# Altium footprint library Wurth_Elektronik_Electromechanic_Wire_to_Board_Connectors_rev16a.PCBLIB: 662 footprints (part 36 of 42)
Each footprint in its own frame and in the unit in brackets; x right, y up, seen from the top. Pads: shape width x height; smd on the part's side, far side on the other; paste and mask are expansions set on the pad; w line width, h text height; cw(c..) or ccw(c..) is an arc to the next point about the centre after c.
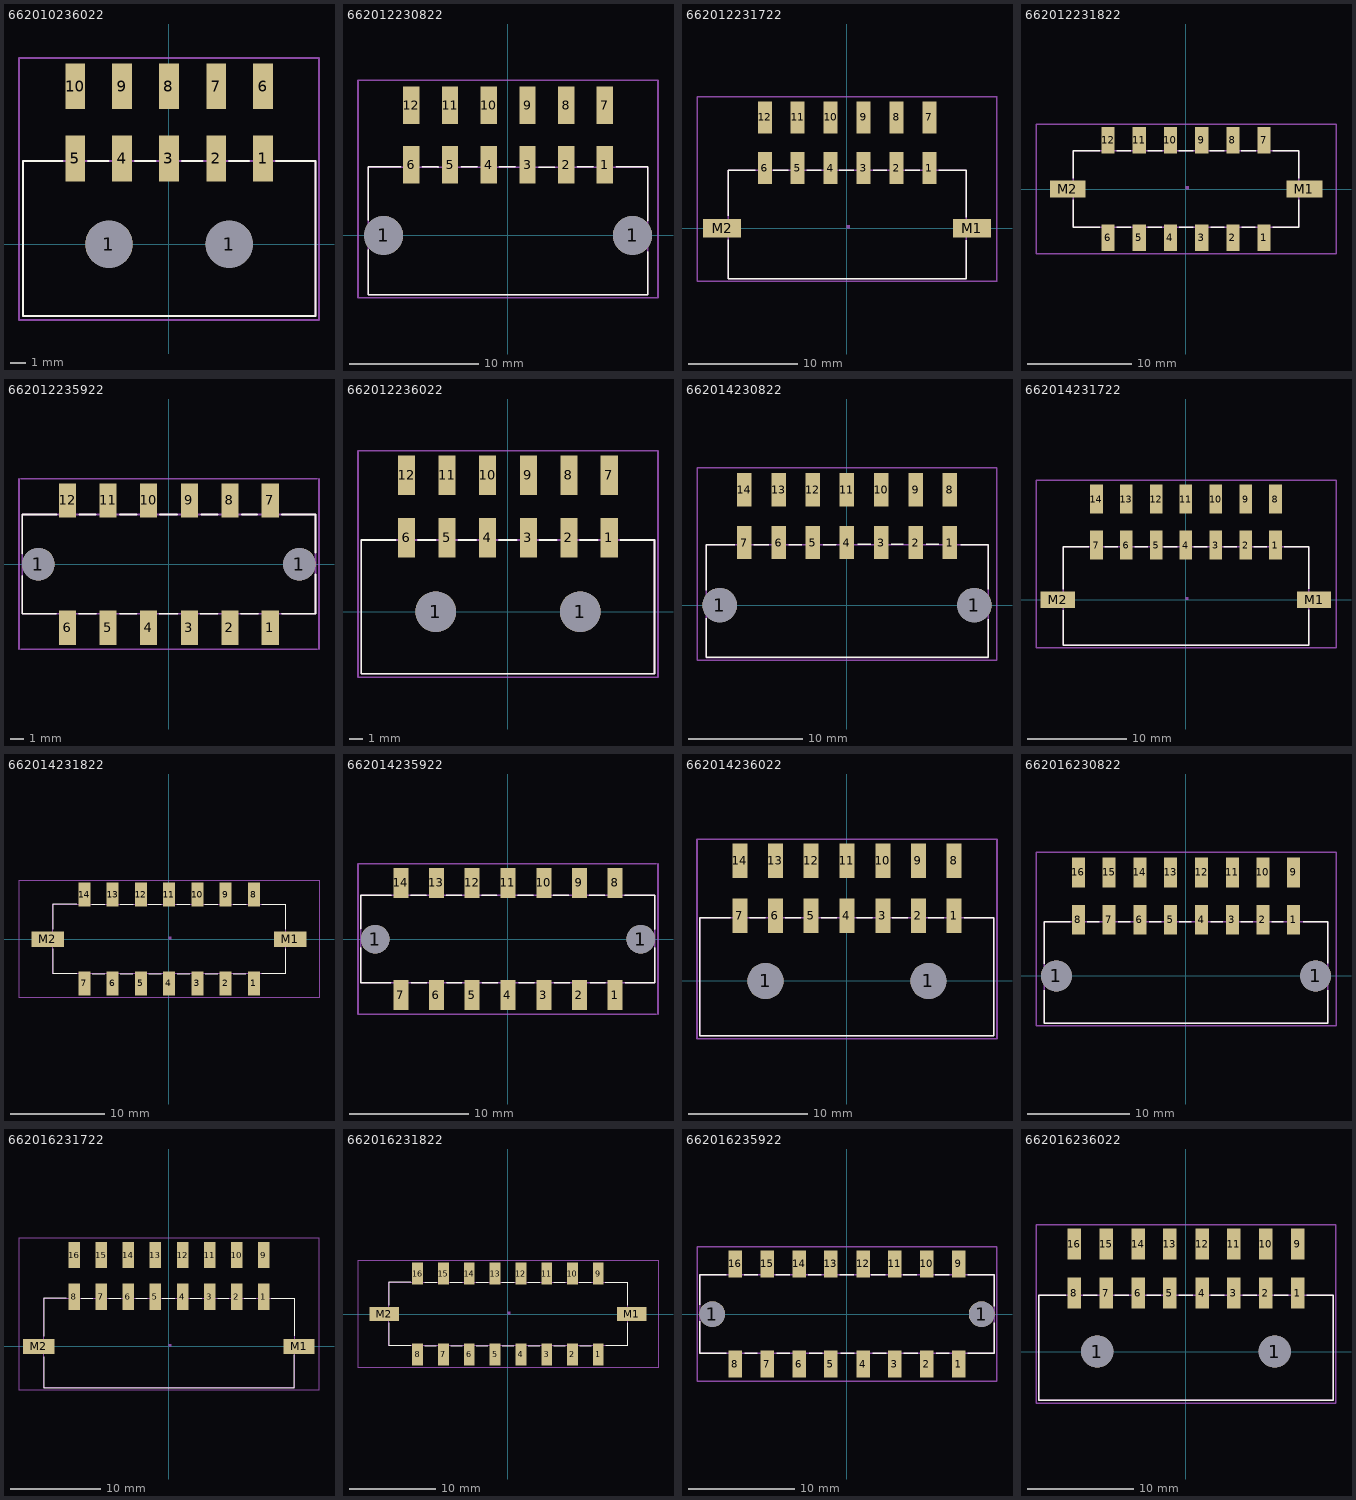
[diagram p35: the footprints below, top view; thin cyan lines are the x and y axes]

## 662010236022 [mil]
pads (12):
  round 119 hole 119: 1(-151.18,0) 1(152,0)
  rect 50x115 smd: 1(237,216) 2(119,216) 3(0,216) 4(-118.11,216) 5(-236.22,216) 6(237,398) 7(119,398) 8(0,398) 9(-118.11,398) 10(-236.22,398)
Top Overlay:
  lines w5: -267.72,209 -368.11,209 -368.11,-181.1 369,-181.1 369,209 269,209 ; -203.54,209 -151.97,209 ; -85.43,209 -33.86,209 ; 33,209 85,209 ; 151,209 202,209
Mechanical 2:
  text ">NAME" at 462,82 h77.5
Mechanical 4:
  text ">VALUE" at 462,7 h77.5
Mechanical 16:
  lines w5: -368.11,-181.1 369,-181.1 369,209 -368.11,209 -368.11,-181.1
  text "1" at 212,157 h77.5
  text "10" at -256.89,391 h77.5
Mechanical 27:
  lines w5: -377.95,-190.94 378,-190.94 378,469 -377.95,469 -377.95,-190.94

## 662012230822 [mil]
pads (14):
  round 119 hole 119: 1(-380.31,0) 1(381,0)
  rect 50x115 smd: 1(296,216) 2(178,216) 3(60,216) 4(-59.06,216) 5(-177.17,216) 6(-295.28,216) 7(296,398) 8(178,398) 9(60,398) 10(-59.06,398) 11(-177.17,398) 12(-295.28,398)
Top Overlay:
  lines w5: -427.17,-43.31 -427.17,-181.1 428,-181.1 428,-50.39 ; -427.17,47 -427.17,210 -327.95,210 ; -262.2,210 -213.78,210 -213.78,209 ; -142.91,210 -94.49,210 ; -26.77,210 22,210 ; 95,209 143,209 ; 212,210 260,210 ; 331,210 428,210 428,45
Mechanical 2:
  text ">NAME" at 521,82 h77.5
Mechanical 4:
  text ">VALUE" at 521,7 h77.5
Mechanical 16:
  lines w5: -427.17,-181.1 428,-181.1 428,209 -427.17,209 -427.17,-181.1
  text "1" at 271,157 h77.5
  text "12" at -329.72,332 h77.5
Mechanical 27:
  lines w5: -458.66,-190.94 459,-190.94 459,475 -458.66,475 -458.66,-190.94

## 662012231722 [mil]
pads (14):
  rect 50x115 smd: 1(296,216) 2(178,216) 3(60,216) 4(-59.06,216) 5(-177.17,216) 6(-295.28,216) 7(296,398) 8(178,398) 9(60,398) 10(-59.06,398) 11(-177.17,398) 12(-295.28,398)
  rect 136x65 smd: M1(449,0) M2(-448.62,0)
Top Overlay:
  lines w5: -427.17,-41.73 -427.17,-181.1 428,-181.1 428,-43.31 ; -427.17,45 -427.17,209 -330.31,209 ; -264.57,209 -211.02,209 ; -144.09,209 -92.91,209 ; -27.17,209 25,209 ; 94,209 143,209 ; 210,209 262,209 ; 329,209 428,209 428,40 ; -92.91,209 -92.91,209
Mechanical 2:
  text ">NAME" at 591,71 h77.5
Mechanical 4:
  text ">VALUE" at 596,-18.31 h77.5
Mechanical 10:
  region: 0,0 10,0 10,10 0,10
Mechanical 16:
  lines w5: -427.17,-181.1 428,-181.1 428,209 -427.17,209 -427.17,-181.1
  text "1" at 271,157 h77.5
  text "12" at -322.83,332 h77.5
Mechanical 27:
  lines w5: 538,473 538,-190.94 ; 539,-190.94 538,-190.94 ; 539,473 -538.98,473 -538.98,-190.94 538,-190.94

## 662012231822 [mil]
pads (14):
  rect 50x100 smd: 1(296,-185.04) 2(178,-185.04) 3(60,-185.04) 4(-59.06,-185.04) 5(-177.17,-185.04) 6(-295.28,-185.04) 7(296,186) 8(178,186) 9(60,186) 10(-59.06,186) 11(-177.17,186) 12(-295.28,186)
  rect 136x65 smd: M1(449,0) M2(-448.62,0)
Top Overlay:
  lines w5: -427.17,-39.76 -427.17,-144.88 -327.95,-144.88 ; -427.17,41 -427.17,145 -327.95,145 ; -263.39,145 -209.06,145 ; -262.2,-144.88 -209.84,-144.88 ; -145.28,145 -90.94,145 ; -144.09,-144.88 -91.73,-144.88 ; -27.17,145 28,145 ; -25.98,-144.88 27,-144.88 ; 91,145 146,145 ; 93,-144.88 145,-144.88 ; 210,145 264,145 ; 211,-144.88 263,-144.88 ; 329,145 428,145 428,41 ; 330,-144.88 428,-144.88 428,-39.76
Mechanical 2:
  text ">NAME" at 744,38 h77.5
Mechanical 4:
  text ">VALUE" at 741,-24.41 h77.5
Mechanical 10:
  region: 0,0 10,0 10,10 0,10
  region: 0,0 10,0 10,10 0,10
  region: 0,0 10,0 10,10 0,10
  region: 0,0 10,0 10,10 0,10
  region: 0,0 10,0 10,10 0,10
  region: 0,0 10,0 10,10 0,10
  region: 0,0 10,0 10,10 0,10
  region: 0,0 10,0 10,10 0,10
  region: 0,0 10,0 10,10 0,10
  region: 0,0 10,0 10,10 0,10
  region: 0,0 10,0 10,10 0,10
Mechanical 16:
  lines w5: -427.17,-144.88 428,-144.88 428,145 -427.17,145 -427.17,-144.88
  text "1" at 282,-216.14 h77.5
  text "12" at -338.19,167 h77.5
Mechanical 27:
  lines w5: -568.9,-246.06 -568.9,247 569,247 569,-246.06 -568.9,-246.06

## 662012235922 [mil]
pads (14):
  round 95 hole 95: 1(-380.31,0) 1(381,0)
  rect 50x100 smd: 1(296,-185.04) 2(178,-185.04) 3(60,-185.04) 4(-59.06,-185.04) 5(-177.17,-185.04) 6(-295.28,-185.04) 7(296,186) 8(178,186) 9(60,186) 10(-59.06,186) 11(-177.17,186) 12(-295.28,186)
Top Overlay:
  lines w5: -427.17,-33.86 -427.17,-144.88 -329.13,-144.88 ; -427.17,31 -427.17,145 -327.17,145 ; -261.81,-144.88 -212.6,-144.88 ; -261.02,145 -212.99,145 ; -142.91,145 -94.09,145 -94.09,146 ; -142.13,-144.88 -94.49,-144.88 ; -27.56,-144.88 25,-144.88 ; -26.38,145 24,145 ; 92,-144.88 142,-144.88 ; 95,145 142,145 ; 210,-144.88 260,-144.88 ; 213,145 258,145 ; 329,-144.88 428,-144.88 428,-30.32 ; 330,145 428,145 428,33
Mechanical 2:
  text ">NAME" at 596,50 h77.5
Mechanical 4:
  text ">VALUE" at 596,-25 h77.5
Mechanical 16:
  lines w5: -427.17,-144.88 428,-144.88 428,145 -427.17,145 -427.17,-144.88
  text "1" at 271,-200 h77.5
  text "12" at -340.94,155 h77.5
Mechanical 27:
  lines w5: -437.01,-248.03 -437.01,249 ; -431.1,-248.03 432,-248.03 ; -431.1,249 432,249 ; 438,-248.03 438,249

## 662012236022 [mil]
pads (14):
  round 119 hole 119: 1(-210.24,0) 1(211,0)
  rect 50x115 smd: 1(296,216) 2(178,216) 3(60,216) 4(-59.06,216) 5(-177.17,216) 6(-295.28,216) 7(296,398) 8(178,398) 9(60,398) 10(-59.06,398) 11(-177.17,398) 12(-295.28,398)
Top Overlay:
  lines w5: -326.77,209 -427.17,209 -427.17,-181.1 428,-181.1 428,209 328,209 ; -262.6,209 -211.02,209 ; -144.49,209 -92.91,209 ; -26.38,209 26,209 ; 92,209 143,209 ; 210,209 262,209
Mechanical 2:
  text ">NAME" at 521,82 h77.5
Mechanical 4:
  text ">VALUE" at 521,7 h77.5
Mechanical 16:
  lines w5: -427.17,-181.1 428,-181.1 428,209 -427.17,209 -427.17,-181.1
  text "1" at 271,157 h77.5
  text "12" at -315.94,391 h77.5
Mechanical 27:
  lines w5: -437.01,-190.94 438,-190.94 438,469 -437.01,469 -437.01,-190.94

## 662014230822 [mil]
pads (16):
  round 119 hole 119: 1(-439.37,0) 1(440,0)
  rect 50x115 smd: 1(355,216) 2(237,216) 3(119,216) 4(0,216) 5(-118.11,216) 6(-236.22,216) 7(-354.33,216) 8(355,398) 9(237,398) 10(119,398) 11(0,398) 12(-118.11,398) 13(-236.22,398) 14(-354.33,398)
Top Overlay:
  lines w5: -486.22,-45.28 -486.22,-180.71 487,-180.71 487,-48.43 ; -486.22,51 -486.22,209 -387.8,209 ; -321.26,209 -270.87,209 ; -201.18,209 -155.91,209 ; -81.1,209 -38.58,209 -38.58,210 ; 38,210 82,210 ; 153,210 195,210 ; 273,210 317,210 ; 393,209 487,209 487,54
Mechanical 2:
  text ">NAME" at 580,82 h77.5
Mechanical 4:
  text ">VALUE" at 580,7 h77.5
Mechanical 16:
  lines w5: -486.22,-181.1 487,-181.1 487,209 -486.22,209 -486.22,-181.1
  text "1" at 330,157 h77.5
  text "14" at -395.67,332 h77.5
Mechanical 27:
  lines w5: -517.72,-190.94 518,-190.94 518,475 -517.72,475 -517.72,-190.94

## 662014231722 [mil]
pads (16):
  rect 50x115 smd: 1(355,216) 2(237,216) 3(119,216) 4(0,216) 5(-118.11,216) 6(-236.22,216) 7(-354.33,216) 8(355,398) 9(237,398) 10(119,398) 11(0,398) 12(-118.11,398) 13(-236.22,398) 14(-354.33,398)
  rect 136x65 smd: M1(508,0) M2(-507.68,0)
Top Overlay:
  lines w5: -486.22,-42.52 -486.22,-181.1 487,-181.1 487,-40.16 ; -486.22,41 -486.22,209 -385.83,209 ; -322.44,209 -270.87,209 ; -203.15,209 -151.97,209 ; -87.01,209 -35.04,209 ; 32,209 85,209 ; 150,209 202,209 202,210 ; 269,209 321,209 ; 390,209 487,209 487,42 ; -35.04,209 -35.04,209
Mechanical 2:
  text ">NAME" at 650,71 h77.5
Mechanical 4:
  text ">VALUE" at 655,-18.31 h77.5
Mechanical 10:
  region: 0,0 10,0 10,10 0,10
Mechanical 16:
  lines w5: -486.22,-181.1 487,-181.1 487,209 -486.22,209 -486.22,-181.1
  text "1" at 330,157 h77.5
  text "14" at -388.78,332 h77.5
Mechanical 27:
  lines w5: -594.09,-190.94 595,-190.94 595,473 -594.09,473 -594.09,-190.94

## 662014231822 [mil]
pads (16):
  rect 50x100 smd: 1(355,-185.04) 2(237,-185.04) 3(119,-185.04) 4(0,-185.04) 5(-118.11,-185.04) 6(-236.22,-185.04) 7(-354.33,-185.04) 8(355,186) 9(237,186) 10(119,186) 11(0,186) 12(-118.11,186) 13(-236.22,186) 14(-354.33,186)
  rect 136x65 smd: M1(508,0) M2(-507.68,0)
Top Overlay:
  lines w5: -486.22,-39.76 -486.22,-144.88 -387.01,-144.88 ; -486.22,41 -486.22,145 -387.01,145 ; -322.44,145 -268.11,145 ; -321.26,-144.88 -268.9,-144.88 ; -204.33,145 -150,145 ; -203.15,-144.88 -150.79,-144.88 ; -86.22,145 -31.89,145 ; -85.04,-144.88 -32.68,-144.88 ; 32,145 87,145 ; 34,-144.88 86,-144.88 ; 150,145 205,145 ; 152,-144.88 204,-144.88 ; 269,145 323,145 ; 270,-144.88 322,-144.88 ; 388,145 487,145 487,41 ; 389,-144.88 487,-144.88 487,-39.76
Mechanical 2:
  text ">NAME" at 744,38 h77.5
Mechanical 4:
  text ">VALUE" at 741,-24.41 h77.5
Mechanical 10:
  region: 0,0 10,0 10,10 0,10
  region: 0,0 10,0 10,10 0,10
  region: 0,0 10,0 10,10 0,10
  region: 0,0 10,0 10,10 0,10
  region: 0,0 10,0 10,10 0,10
  region: 0,0 10,0 10,10 0,10
  region: 0,0 10,0 10,10 0,10
  region: 0,0 10,0 10,10 0,10
  region: 0,0 10,0 10,10 0,10
  region: 0,0 10,0 10,10 0,10
  region: 0,0 10,0 10,10 0,10
  region: 0,0 10,0 10,10 0,10
  region: 0,0 10,0 10,10 0,10
Mechanical 16:
  lines w5: -486.22,-144.88 487,-144.88 487,145 -486.22,145 -486.22,-144.88
  text "1" at 341,-216.14 h77.5
  text "14" at -404.13,167 h77.5
Mechanical 27:
  lines w5: -627.95,-246.06 -627.95,247 628,247 628,-246.06 -627.95,-246.06

## 662014235922 [mil]
pads (16):
  round 95 hole 95: 1(-439.37,0) 1(440,0)
  rect 50x100 smd: 1(355,-185.04) 2(237,-185.04) 3(119,-185.04) 4(0,-185.04) 5(-118.11,-185.04) 6(-236.22,-185.04) 7(-354.33,-185.04) 8(355,186) 9(237,186) 10(119,186) 11(0,186) 12(-118.11,186) 13(-236.22,186) 14(-354.33,186)
Top Overlay:
  lines w5: -486.22,-28.74 -486.22,-144.88 -387.01,-144.88 ; -486.22,34 -486.22,145 -386.22,145 ; -322.05,145 -270.47,145 ; -320.47,-144.88 -268.5,-144.88 ; -203.94,145 -153.15,145 ; -202.36,-144.88 -151.97,-144.88 ; -85.83,145 -37.01,145 ; -84.25,-144.88 -32.68,-144.88 ; 32,145 84,145 ; 36,-144.88 88,-144.88 ; 151,145 201,145 ; 153,-144.88 205,-144.88 ; 269,145 320,145 ; 273,-144.88 323,-144.88 ; 387,145 487,145 487,32 ; 389,-144.49 389,-144.88 487,-144.88 487,-28.74 ; -270.47,145 -270.47,145
Mechanical 2:
  text ">NAME" at 537,90 h77.5
Mechanical 4:
  text ">VALUE" at 537,15 h77.5
Mechanical 16:
  lines w5: -486.22,-144.88 487,-144.88 487,145 -486.22,145 -486.22,-144.88
  text "1" at 330,-200 h77.5
  text "14" at -406.89,155 h77.5
Mechanical 27:
  lines w5: 491,-248.03 -496.06,-248.03 -496.06,249 491,249 ; 497,-248.03 497,249

## 662014236022 [mil]
pads (16):
  round 119 hole 119: 1(-269.29,0) 1(270,0)
  rect 50x115 smd: 1(355,216) 2(237,216) 3(119,216) 4(0,216) 5(-118.11,216) 6(-236.22,216) 7(-354.33,216) 8(355,398) 9(237,398) 10(119,398) 11(0,398) 12(-118.11,398) 13(-236.22,398) 14(-354.33,398)
Top Overlay:
  lines w5: -385.83,209 -486.22,209 -486.22,-181.1 487,-181.1 487,209 388,209 ; -321.65,209 -270.08,209 ; -203.54,209 -151.97,209 ; -85.43,209 -33.86,209 ; 33,209 84,209 ; 151,209 202,209 ; 269,209 321,209
Mechanical 2:
  text ">NAME" at 580,82 h77.5
Mechanical 4:
  text ">VALUE" at 580,7 h77.5
Mechanical 16:
  lines w5: -486.22,-181.1 487,-181.1 487,209 -486.22,209 -486.22,-181.1
  text "1" at 330,157 h77.5
  text "14" at -375,391 h77.5
Mechanical 27:
  lines w5: -496.06,-190.94 497,-190.94 497,469 -496.06,469 -496.06,-190.94

## 662016230822 [mil]
pads (18):
  round 119 hole 119: 1(-498.43,0) 1(499,0)
  rect 50x115 smd: 1(414,216) 2(296,216) 3(178,216) 4(60,216) 5(-59.06,216) 6(-177.17,216) 7(-295.28,216) 8(-413.39,216) 9(414,398) 10(296,398) 11(178,398) 12(60,398) 13(-59.06,398) 14(-177.17,398) 15(-295.28,398) 16(-413.39,398)
Top Overlay:
  lines w5: -545.28,-54.72 -545.28,-181.1 546,-181.1 546,-55.91 ; -545.28,47 -545.28,209 -444.88,209 ; -379.53,209 -333.07,209 ; -260.63,209 -214.17,209 ; -142.13,209 -95.67,209 ; -26.38,209 21,209 ; 95,209 142,209 ; 210,209 256,209 ; 329,209 375,209 ; 451,209 546,209 546,48
Mechanical 2:
  text ">NAME" at 639,82 h77.5
Mechanical 4:
  text ">VALUE" at 639,7 h77.5
Mechanical 16:
  lines w5: -545.28,-181.1 546,-181.1 546,209 -545.28,209 -545.28,-181.1
  text "1" at 389,157 h77.5
  text "16" at -436.61,332 h77.5
Mechanical 27:
  lines w5: -576.77,-190.94 577,-190.94 577,475 -576.77,475 -576.77,-190.94

## 662016231722 [mil]
pads (18):
  rect 50x115 smd: 1(414,216) 2(296,216) 3(178,216) 4(60,216) 5(-59.06,216) 6(-177.17,216) 7(-295.28,216) 8(-413.39,216) 9(414,398) 10(296,398) 11(178,398) 12(60,398) 13(-59.06,398) 14(-177.17,398) 15(-295.28,398) 16(-413.39,398)
  rect 136x65 smd: M1(567,0) M2(-566.73,0)
Top Overlay:
  lines w5: -545.28,-181.1 546,-181.1 546,-37.01 ; -545.28,-180.31 -545.28,-45.28 ; -545.28,45 -545.28,209 -446.46,209 ; -381.89,209 -331.5,209 ; -261.02,209 -210.63,209 ; -145.28,209 -93.31,209 ; -27.95,209 26,209 ; 93,209 143,209 ; 212,209 261,209 ; 329,209 378,209 378,210 ; 445,209 546,209 546,47
Mechanical 2:
  text ">NAME" at 709,71 h77.5
Mechanical 4:
  text ">VALUE" at 714,-18.31 h77.5
Mechanical 10:
  region: 0,0 10,0 10,10 0,10
Mechanical 16:
  lines w5: -545.28,-181.1 546,-181.1 546,209 -545.28,209 -545.28,-181.1
  text "1" at 389,157 h77.5
  text "16" at -454.72,332 h77.5
Mechanical 27:
  lines w5: -653.15,-190.94 654,-190.94 654,473 -653.15,473 -653.15,-190.94

## 662016231822 [mil]
pads (18):
  rect 50x100 smd: 1(414,-185.04) 2(296,-185.04) 3(178,-185.04) 4(60,-185.04) 5(-59.06,-185.04) 6(-177.17,-185.04) 7(-295.28,-185.04) 8(-413.39,-185.04) 9(414,186) 10(296,186) 11(178,186) 12(60,186) 13(-59.06,186) 14(-177.17,186) 15(-295.28,186) 16(-413.39,186)
  rect 136x65 smd: M1(567,0) M2(-566.73,0)
Top Overlay:
  lines w5: -545.28,-39.76 -545.28,-144.88 -446.06,-144.88 ; -545.28,41 -545.28,145 -446.06,145 ; -381.5,145 -327.17,145 ; -380.31,-144.88 -327.95,-144.88 ; -263.39,145 -209.06,145 ; -262.2,-144.88 -209.84,-144.88 ; -145.28,145 -90.94,145 ; -144.09,-144.88 -91.73,-144.88 ; -27.17,145 28,145 ; -25.98,-144.88 27,-144.88 ; 91,145 146,145 ; 93,-144.88 145,-144.88 ; 210,145 264,145 ; 211,-144.88 263,-144.88 ; 328,145 382,145 ; 329,-144.88 381,-144.88 ; 447,145 546,145 546,41 ; 449,-144.88 546,-144.88 546,-39.76
Mechanical 2:
  text ">NAME" at 803,-21.26 h77.5
Mechanical 4:
  text ">VALUE" at 800,-83.46 h77.5
Mechanical 10:
  region: 0,0 10,0 10,10 0,10
  region: 0,0 10,0 10,10 0,10
  region: 0,0 10,0 10,10 0,10
  region: 0,0 10,0 10,10 0,10
  region: 0,0 10,0 10,10 0,10
  region: 0,0 10,0 10,10 0,10
  region: 0,0 10,0 10,10 0,10
  region: 0,0 10,0 10,10 0,10
  region: 0,0 10,0 10,10 0,10
  region: 0,0 10,0 10,10 0,10
  region: 0,0 10,0 10,10 0,10
  region: 0,0 10,0 10,10 0,10
  region: 0,0 10,0 10,10 0,10
  region: 0,0 10,0 10,10 0,10
  region: 0,0 10,0 10,10 0,10
Mechanical 16:
  lines w5: -545.28,-144.88 546,-144.88 546,145 -545.28,145 -545.28,-144.88
  text "1" at 400,-216.14 h77.5
  text "16" at -445.08,167 h77.5
Mechanical 27:
  lines w5: -687.01,-246.06 -687.01,247 688,247 688,-246.06 -687.01,-246.06

## 662016235922 [mil]
pads (18):
  round 95 hole 95: 1(-498.43,0) 1(499,0)
  rect 50x100 smd: 1(414,-185.04) 2(296,-185.04) 3(178,-185.04) 4(60,-185.04) 5(-59.06,-185.04) 6(-177.17,-185.04) 7(-295.28,-185.04) 8(-413.39,-185.04) 9(414,186) 10(296,186) 11(178,186) 12(60,186) 13(-59.06,186) 14(-177.17,186) 15(-295.28,186) 16(-413.39,186)
Top Overlay:
  lines w5: -545.67,-27.17 -545.28,-27.17 -545.28,-144.88 -446.85,-144.88 ; -545.67,35 -545.67,145 -446.06,145 ; -380.31,145 -329.53,145 ; -379.13,-144.88 -331.1,-144.88 ; -262.99,145 -211.81,145 ; -259.06,-144.88 -212.2,-144.88 ; -143.31,145 -94.09,145 ; -139.76,-144.88 -90.55,-144.88 ; -26.38,145 26,145 ; -22.44,-144.88 27,-144.88 ; 91,145 143,145 ; 95,-144.88 145,-144.88 ; 209,145 259,145 ; 210,-144.88 262,-144.88 ; 327,145 379,145 379,146 ; 331,-144.88 380,-144.88 ; 447,145 546,145 546,30 ; 448,-144.88 546,-144.88 546,-31.5 545,-31.5
Mechanical 2:
  text ">NAME" at 596,50 h77.5
Mechanical 4:
  text ">VALUE" at 596,-25 h77.5
Mechanical 16:
  lines w5: -545.28,-144.88 546,-144.88 546,145 -545.28,145 -545.28,-144.88
  text "1" at 389,-200 h77.5
  text "16" at -465.94,155 h77.5
Mechanical 27:
  lines w5: -555.12,-248.03 556,-248.03 556,249 -555.12,249 -555.12,-248.03

## 662016236022 [mil]
pads (18):
  round 119 hole 119: 1(-328.35,0) 1(329,0)
  rect 50x115 smd: 1(414,216) 2(296,216) 3(178,216) 4(60,216) 5(-59.06,216) 6(-177.17,216) 7(-295.28,216) 8(-413.39,216) 9(414,398) 10(296,398) 11(178,398) 12(60,398) 13(-59.06,398) 14(-177.17,398) 15(-295.28,398) 16(-413.39,398)
Top Overlay:
  lines w5: -444.88,209 -545.28,209 -545.28,-181.1 546,-181.1 546,209 447,209 ; -380.71,209 -329.13,209 ; -262.6,209 -211.02,209 ; -144.49,209 -92.91,209 ; -26.77,209 25,209 ; 92,209 143,209 ; 210,209 262,209 ; 328,209 380,209
Mechanical 2:
  text ">NAME" at 639,82 h77.5
Mechanical 4:
  text ">VALUE" at 639,7 h77.5
Mechanical 16:
  lines w5: -545.28,-181.1 546,-181.1 546,209 -545.28,209 -545.28,-181.1
  text "1" at 389,157 h77.5
  text "16" at -434.06,332 h77.5
Mechanical 27:
  lines w5: -555.12,-190.94 556,-190.94 556,469 -555.12,469 -555.12,-190.94